# Altium footprint library devkit-visao.PcbLib: 48 footprints (part 2 of 3)
Each footprint in its own frame and in the unit in brackets; x right, y up, seen from the top. Pads: shape width x height; smd on the part's side, far side on the other; paste and mask are expansions set on the pad; w line width, h text height; cw(c..) or ccw(c..) is an arc to the next point about the centre after c.
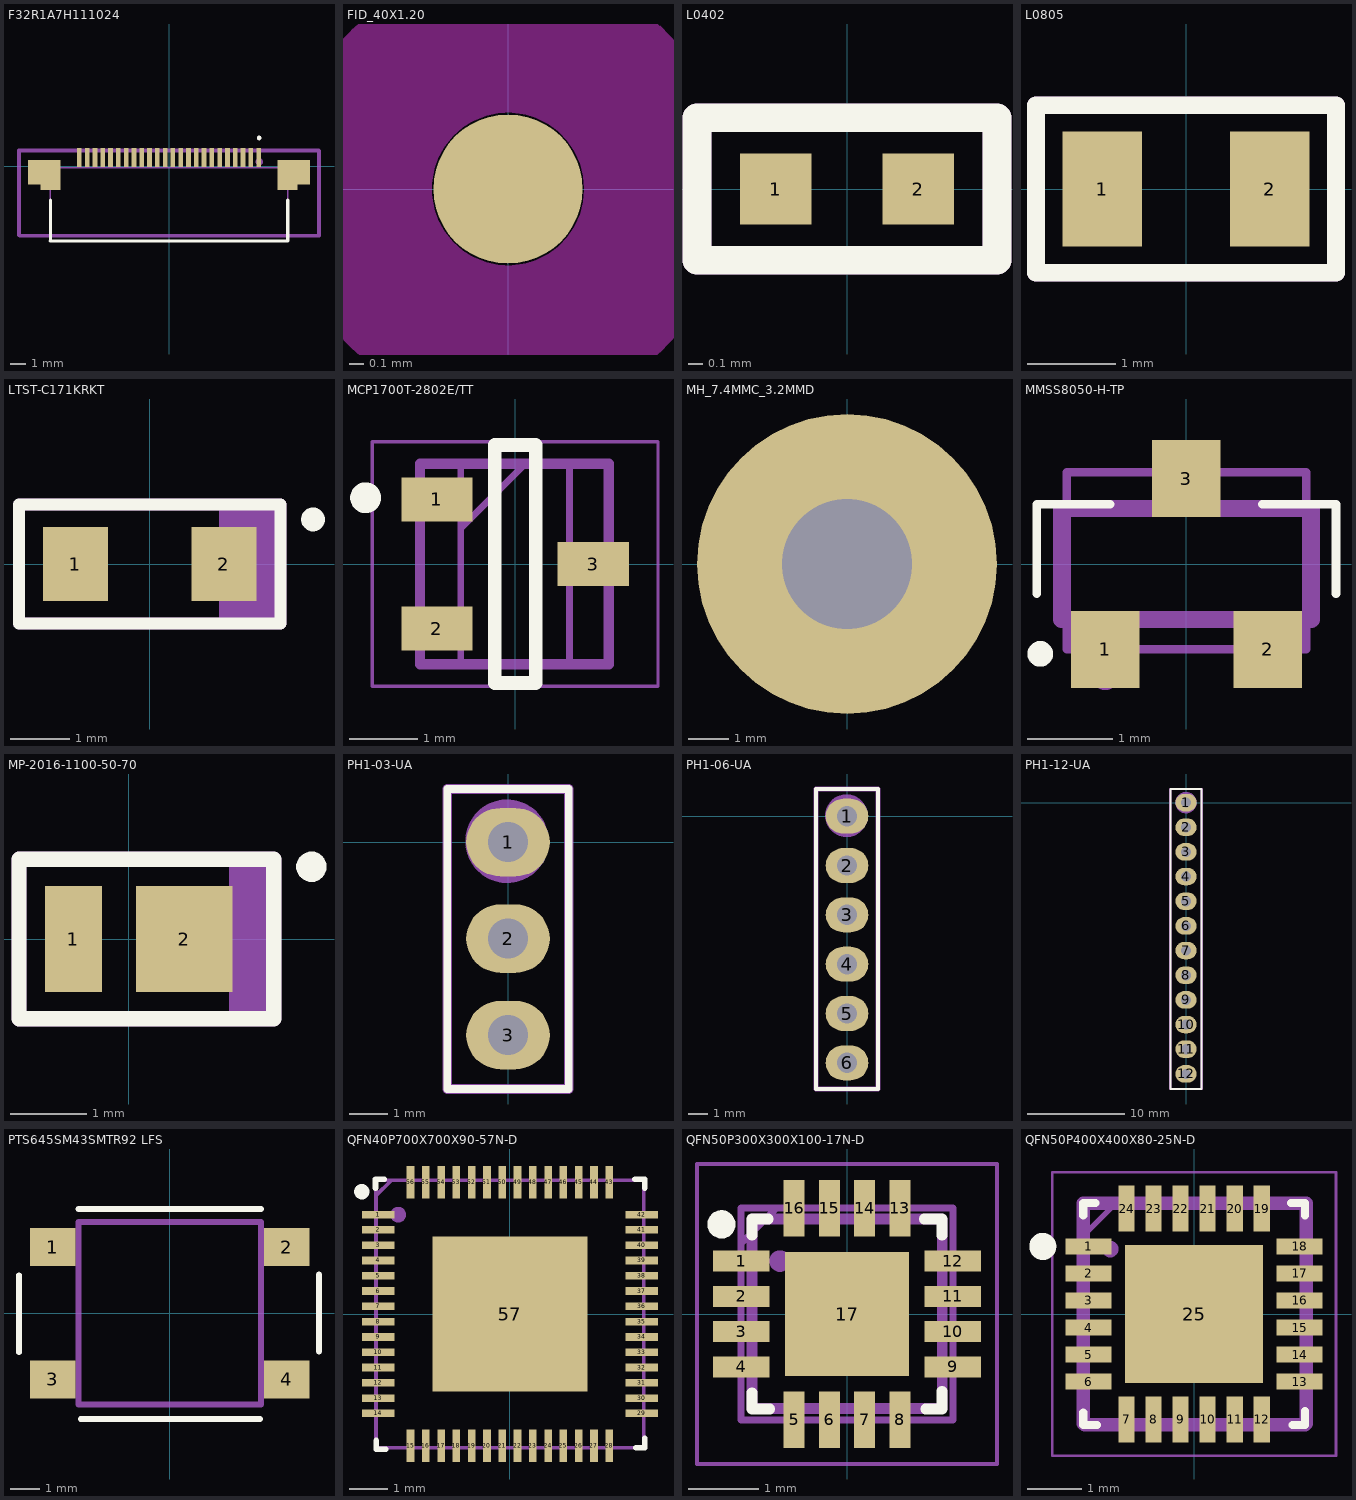
[diagram p1: the footprints below, top view; thin cyan lines are the x and y axes]

## F32R1A7H111024 [mm]
pads (28):
  rect 0.3x1.2 smd mask+0.051: 1(5.75,0.563) 2(5.25,0.563) 3(4.75,0.563) 4(4.25,0.563) 5(3.75,0.563) 6(3.25,0.563) 7(2.75,0.563) 8(2.25,0.563) 9(1.75,0.563) 10(1.25,0.563) 11(0.75,0.563) 12(0.25,0.563) 13(-0.25,0.563) 14(-0.75,0.563) 15(-1.25,0.563) 16(-1.75,0.563) 17(-2.25,0.563) 18(-2.75,0.563) 19(-3.25,0.563) 20(-3.75,0.563) 21(-4.25,0.563) 22(-4.75,0.563) 23(-5.25,0.563) 24(-5.75,0.563)
  rect 0.8x1.6 smd: ""(-8.65,-0.387) ""(8.65,-0.387)
  rect 1.3x1.95 smd: ""(-7.6,-0.562) ""(7.6,-0.562)
Top Overlay:
  lines w0.2: 5.782,1.763 cw(c5.782,1.813) 5.782,1.863 ; 5.782,1.763 ccw(c5.782,1.813) 5.782,1.863 ; 5.782,1.763 cw(c5.782,1.813) 5.782,1.863 ; 7.62,-4.787 7.62,-2.187 7.62,-4.787 ; 7.62,-4.787 -7.62,-4.787 7.62,-4.787 ; -7.6,-4.787 -7.6,-2.187 -7.6,-4.787
Mechanical 13:
  lines w0.1: -7.62,-4.787 -7.62,-0.087 7.62,-0.087 7.62,-4.787 -7.62,-4.787
Mechanical 29:
  circle w0.254: c5.791,0.279 r0.106
  lines w0.254: -9.625,-4.412 -9.575,-4.462 9.6,-4.462 9.625,-4.437 9.625,0.988 9.6,1.013 -9.625,1.013 -9.625,-4.412
  text "'.Designator'" at -5.921,-2.565 h1
3D body "f32r_24pin_asm.stp": height 2.08, standoff -0.02, extent -9.65,-4.469 9.65,1.031

## FID_40X1.20 [mil]
pads (1):
  round 40 smd paste-40 mask+40: ""(0,0)
Top Layer keep-out:
  circle w39.37: c0,0 r40.16

## L0402 [mm]
pads (2):
  rect 0.5x0.5 smd mask+0.064: 1(-0.5,0) 2(0.5,0)
Top Overlay:
  lines w0.2: -1.05,-0.5 1.05,-0.5 1.05,0.5 -1.05,0.5 -1.05,-0.5
Mechanical 29:
  lines w0.2: -1.05,-0.5 -1.05,0.5 1.05,0.5 1.05,-0.5 -1.05,-0.5
  text "'.Designator'" at -0.75,-0.169 h0.5
3D body "L0805.step": height 0.51, standoff 0.01, extent -0.5,-0.3 0.5,0.3

## L0805 [mm]
pads (2):
  rect 0.9x1.3 smd: 1(-0.95,0) 2(0.95,0)
Top Overlay:
  lines w0.2: -1.7,-0.95 1.7,-0.95 1.7,0.95 -1.7,0.95 -1.7,-0.95
Mechanical 29:
  lines w0.2: -1.7,-0.95 -1.7,0.95 1.7,0.95 1.7,-0.95 -1.7,-0.95
  text "'.Designator'" at -1.3,-0.4 h0.85
3D body "L0805.step": height 1.05, standoff 0, extent -1,-0.625 1,0.625

## LTST-C171KRKT [mm]
pads (2):
  rect 1.1x1.25 smd: 1(-1.25,0) 2(1.25,0)
Top Overlay:
  circle w0.2: c2.75,0.75 r0.1
  lines w0.2: -2.2,-1 -2.2,1 2.2,1 2.2,-1 -2.2,-1
Mechanical 29:
  rectangle: 1.163,-1 2.2,1
  lines w0.2: -2.2,-1 2.2,-1 2.2,1 -2.2,1 -2.2,-1
  text "'.Designator'" at -1.861,-1 h1
3D body "LED SMD 0805 RED.step": height 0.8, standoff 0, extent -1,-0.625 1,0.625

## MCP1700T-2802E/TT [mm]
pads (3):
  rect 1.05x0.65 smd: 1(-1.15,0.95) 2(-1.15,-0.95) 3(1.15,0)
Top Overlay:
  circle w0.23: c-2.199,0.974 r0.112
  lines w0.2: -0.3,-1.75 0.3,-1.75 0.3,1.75 0.15,1.75 -0.15,1.75 -0.3,1.75 -0.3,-1.75
Mechanical 13:
  lines w0.1: -0.8,0.53 0.15,1.48 ; -0.8,-1.48 -0.8,1.48 0.8,1.48 0.8,-1.48 -0.8,-1.48
Mechanical 15:
  lines w0.05: -2.1,-1.8 -2.1,1.8 2.1,1.8 2.1,-1.8 -2.1,-1.8
Mechanical 29:
  circle w0.254: c-0.95,0.95 r0.112
  lines w0.15: -1.4,-1.475 1.375,-1.475 1.375,1.475 -0.15,1.475 -1.4,1.475 -1.4,-1.475
  text "'.Designator'" at -1.8,-0.35 h0.5
3D body "AP2138N-1.8TRG1.stp": height 1.3, standoff 0, extent -1.412,-1.48 1.412,1.48

## MH_7.4MMC_3.2MMD [mm]
pads (1):
  round 7.4 hole 3.2: ""(0,0)

## MMSS8050-H-TP [mm]
pads (3):
  rect 0.8x0.9 smd: 1(-0.95,-1) 2(0.95,-1) 3(0,1)
Top Overlay:
  lines w0.1: -1.75,-0.35 -1.75,0.7 -0.89,0.7 ; 0.89,0.7 1.75,0.7 1.75,-0.35
  lines w0.2: -1.76,-1.052 ccw(c-1.71,-1.052) -1.66,-1.052 ccw(c-1.71,-1.052) -1.76,-1.052
Mechanical 13:
  lines w0.2: -1.46,-0.65 -1.46,0.65 1.46,0.65 1.46,-0.65 -1.46,-0.65
Mechanical 29:
  lines w0.1: -1.4,-1 -1.4,1.075 1.4,1.075 1.4,-1 -1.4,-1
  lines w0.2: -1,-1.325 ccw(c-0.95,-1.325) -0.9,-1.325 ccw(c-0.95,-1.325) -1,-1.325
  text "'.Designator'" at -2.35,-0.25 h0.8
3D body "MMSS8050-H-TP.stp": height 0.89, standoff -0.01, extent -1.4,-1.05 1.4,1.05

## MP-2016-1100-50-70 [mm]
pads (2):
  rect 0.75x1.4 smd: 1(-0.73,0)
  rect 1.27x1.4 smd: 2(0.73,0)
Top Overlay:
  circle w0.2: c2.4,0.95 r0.1
  lines w0.2: -1.445,-1.05 -1.445,1.05 ; -1.425,-1.05 1.905,-1.05 1.905,1.05 1.117,1.05 -0.858,1.05 -1.425,1.05
Mechanical 29:
  rectangle: 1.318,-0.975 1.905,1.05
  lines w0.2: -1.445,-1.05 -1.445,1.05 ; -1.425,-1.05 1.905,-1.05 1.905,-0.375 1.905,0.375 1.905,1.05 -1.425,1.05
  text "'.Designator'" at -1.3,-0.725 h0.8
3D body "MP-2016-1100-50-70--3DModel-STEP-483804.STEP": height 2.26, standoff 1.74, extent -0.949,-0.777 1.051,0.823

## PH1-03-UA [mm]
pads (3):
  oval 2.2x1.8 hole 1.05: 1(0,0) 2(0,-2.54) 3(0,-5.08)
Top Overlay:
  lines w0.2: -1.6,-6.5 -1.6,1.4 1.6,1.4 1.6,-6.5 -1.6,-6.5
Mechanical 29:
  circle w1.2: c-0.025,0.025 r0.5
  lines w0.254: -1.6,-6.5 1.6,-6.5 1.6,1.4 -1.6,1.4 -1.6,-6.5
  text "'.Designator'" at 0.483,-7.798 h1.52
3D body "PH1-03-UA.STEP": height 5.6, standoff -5.95, extent -1.25,-6.357 1.25,1.27

## PH1-06-UA [mm]
pads (6):
  oval 2.2x1.8 hole 1.05: 1(0,0) 2(0,-2.54) 3(0,-5.08) 4(0,-7.62) 5(0,-10.16) 6(0,-12.7)
Top Overlay:
  lines w0.2: -1.6,-14.046 1.6,-14.046 1.6,1.4 -1.6,1.4 -1.6,-14.046
Mechanical 29:
  circle w1.2: c-0.025,0.025 r0.5
  lines w0.254: -1.6,-14.046 -1.6,1.4 1.6,1.4 1.6,-14.046 -1.6,-14.046
  text "'.Designator'" at 0.775,-14.325 h1.52
3D body "User Library-1x6 TH Pitch 2_54mm.STEP": height 9.2, standoff -3.5, extent -1.3,-13.92 1.24,1.32

## PH1-12-UA [mm]
pads (12):
  oval 2.2x1.8 hole 1.05: 1(0,0) 2(0,-2.54) 3(0,-5.08) 4(0,-7.62) 5(0,-10.16) 6(0,-12.7) 7(0,-15.24) 8(0,-17.78) 9(0,-20.32) 10(0,-22.86) 11(0,-25.4) 12(0,-27.94)
Top Overlay:
  lines w0.2: -1.6,-29.5 -1.6,1.4 1.6,1.4 1.6,-29.5 -1.6,-29.5
Mechanical 29:
  circle w1.2: c0,0 r0.5
  lines w0.254: -1.6,-29.5 -1.6,1.4 1.6,1.4 1.6,-29.5 -1.6,-29.5
  text "'.Designator'" at 0.803,-22.191 h1.52
3D body "PH1-12-UA v3.step": height 9.66, standoff -3.51, extent -1.203,-29.227 1.3,1.227

## PTS645SM43SMTR92 LFS [mm]
pads (4):
  rect 1.55x1.3 smd: 1(-3.975,2.25) 2(3.975,2.25) 3(-3.975,-2.25) 4(3.975,-2.25)
Top Overlay:
  lines w0.2: -5.125,-1.325 -5.125,1.291 ; -3.1,3.55 3.1,3.55 ; -3.025,-3.6 3.075,-3.6 ; 5.075,-1.3 5.075,1.316
Mechanical 29:
  lines w0.2: -3.1,-3.1 -3.1,3.1 3.1,3.1 3.1,-3.1 -3.1,-3.1
  text "'.Designator'" at -3.725,-0.375 h1
3D body "User Library-PTS645SL50SMTR92-LFS.STEP": height 5, standoff 0, extent -4.5,-3 4.5,3

## QFN40P700X700X90-57N-D [mm]
pads (57):
  rect 0.85x0.2 smd mask+0.076: 1(-3.45,2.6) 2(-3.45,2.2) 3(-3.45,1.8) 4(-3.45,1.4) 5(-3.45,1) 6(-3.45,0.6) 7(-3.45,0.2) 8(-3.45,-0.2) 9(-3.45,-0.6) 10(-3.45,-1) 11(-3.45,-1.4) 12(-3.45,-1.8) 13(-3.45,-2.2) 14(-3.45,-2.6) 29(3.45,-2.6) 30(3.45,-2.2) 31(3.45,-1.8) 32(3.45,-1.4) 33(3.45,-1) 34(3.45,-0.6) 35(3.45,-0.2) 36(3.45,0.2) 37(3.45,0.6) 38(3.45,1) 39(3.45,1.4) 40(3.45,1.8) 41(3.45,2.2) 42(3.45,2.6)
  rect 0.2x0.85 smd mask+0.076: 15(-2.6,-3.45) 16(-2.2,-3.45) 17(-1.8,-3.45) 18(-1.4,-3.45) 19(-1,-3.45) 20(-0.6,-3.45) 21(-0.2,-3.45) 22(0.2,-3.45) 23(0.6,-3.45) 24(1,-3.45) 25(1.4,-3.45) 26(1.8,-3.45) 27(2.2,-3.45) 28(2.6,-3.45) 43(2.6,3.45) 44(2.2,3.45) 45(1.8,3.45) 46(1.4,3.45) 47(1,3.45) 48(0.6,3.45) 49(0.2,3.45) 50(-0.2,3.45) 51(-0.6,3.45) 52(-1,3.45) 53(-1.4,3.45) 54(-1.8,3.45) 55(-2.2,3.45) 56(-2.6,3.45)
  rect 4.05x4.05 smd: 57(0,0)
Top Overlay:
  circle w0.2: c-3.875,3.2 r0.1
  lines w0.15: -3.514,3.296 -3.514,3.525 -3.286,3.525 ; -3.5,-3.311 -3.5,-3.539 -3.246,-3.539 ; 3.271,3.525 3.525,3.525 3.525,3.296 ; 3.296,-3.502 3.525,-3.502 3.525,-3.248
Mechanical 29:
  circle w0.254: c-2.925,2.6 r0.079
  lines w0.1: -3.5,3.1 -3.1,3.5 ; -3.5,-3.5 -3.5,3.5 3.5,3.5 3.5,-3.5 -3.5,-3.5
  text "'.Designator'" at -3.1,-0.325 h1.52
3D body "ESP32-S2.stp": height 0.9, standoff 0, extent -3.55,-3.55 3.55,3.55

## QFN50P300X300X100-17N-D [mm]
pads (17):
  rect 0.8x0.3 smd mask+0.053: 1(-1.5,0.75) 2(-1.5,0.25) 3(-1.5,-0.25) 4(-1.5,-0.75) 9(1.5,-0.75) 10(1.5,-0.25) 11(1.5,0.25) 12(1.5,0.75)
  rect 0.3x0.8 smd mask+0.053: 5(-0.75,-1.5) 6(-0.25,-1.5) 7(0.25,-1.5) 8(0.75,-1.5) 13(0.75,1.5) 14(0.25,1.5) 15(-0.25,1.5) 16(-0.75,1.5)
  rect 1.75x1.75 smd: 17(0,0)
Top Overlay:
  circle w0.2: c-1.778,1.27 r0.1
  lines w0.15: -1.346,-1.118 -1.346,-1.346 -1.092,-1.346 ; -1.346,1.118 -1.346,1.346 -1.118,1.346 ; 1.092,1.346 1.346,1.346 1.346,1.118 ; 1.118,-1.346 1.346,-1.346 1.346,-1.092
Mechanical 13:
  lines w0.1: -1.5,1 -1,1.5 ; -1.5,-1.5 -1.5,1.5 1.5,1.5 1.5,-1.5 -1.5,-1.5
Mechanical 15:
  lines w0.05: -2.125,-2.125 -2.125,2.125 2.125,2.125 2.125,-2.125 -2.125,-2.125
Mechanical 29:
  circle w0.254: c-0.95,0.75 r0.025
  lines w0.15: -1.346,-1.345 -1.34,-1.339 1.352,-1.339 1.352,1.339 1.345,1.346 -1.346,1.346 -1.346,-1.345
  text "'.Designator'" at -1.143,-0.152 h0.2
3D body "BQ24076RGTR.stp": height 1, standoff 0, extent -1.55,-1.55 1.55,1.55

## QFN50P400X400X80-25N-D [mm]
pads (25):
  rect 0.85x0.3 smd mask+0.053: 1(-1.95,1.25) 6(-1.95,-1.25) 13(1.95,-1.25) 18(1.95,1.25)
  rect 0.85x0.3 smd mask+0.085: 2(-1.95,0.75) 3(-1.95,0.25) 4(-1.95,-0.25) 5(-1.95,-0.75) 14(1.95,-0.75) 15(1.95,-0.25) 16(1.95,0.25) 17(1.95,0.75)
  rect 0.3x0.85 smd mask+0.053: 7(-1.25,-1.95) 12(1.25,-1.95) 19(1.25,1.95) 24(-1.25,1.95)
  rect 0.3x0.85 smd mask+0.085: 8(-0.75,-1.95) 9(-0.25,-1.95) 10(0.25,-1.95) 11(0.75,-1.95) 20(0.75,1.95) 21(0.25,1.95) 22(-0.25,1.95) 23(-0.75,1.95)
  rect 2.55x2.55 smd: 25(0,0)
Top Overlay:
  circle w0.25: c-2.8,1.25 r0.125
  lines w0.15: -2.05,-1.821 -2.05,-2.05 -1.796,-2.05 ; -2.05,1.821 -2.05,2.05 -1.821,2.05 ; 1.796,2.05 2.05,2.05 2.05,1.821 ; 1.821,-2.052 2.05,-2.052 2.05,-1.798
Mechanical 13:
  lines w0.1: -2,1.5 -1.5,2 ; -2,-2 -2,2 2,2 2,-2 -2,-2
Mechanical 15:
  lines w0.05: -2.625,-2.625 -2.625,2.625 2.625,2.625 2.625,-2.625 -2.625,-2.625
Mechanical 29:
  circle w0.254: c-1.55,1.2 r0.025
  lines w0.254: -2.05,-2.025 -2.025,-2.05 2.05,-2.05 2.075,-2.025 2.075,2.05 -2.05,2.05 -2.05,-2.025
  text "'.Designator'" at -3.425,-0.325 h1.52
3D body "CP2102N-A02-GQFN24R.stp": height 0.8, standoff 0, extent -2.05,-2.05 2.05,2.05